# Altium footprint library Cty1.PcbLib: 1378 footprints (part 76 of 87)
Each footprint in its own frame and in the unit in brackets; x right, y up, seen from the top. Pads: shape width x height; smd on the part's side, far side on the other; paste and mask are expansions set on the pad; w line width, h text height; cw(c..) or ccw(c..) is an arc to the next point about the centre after c.
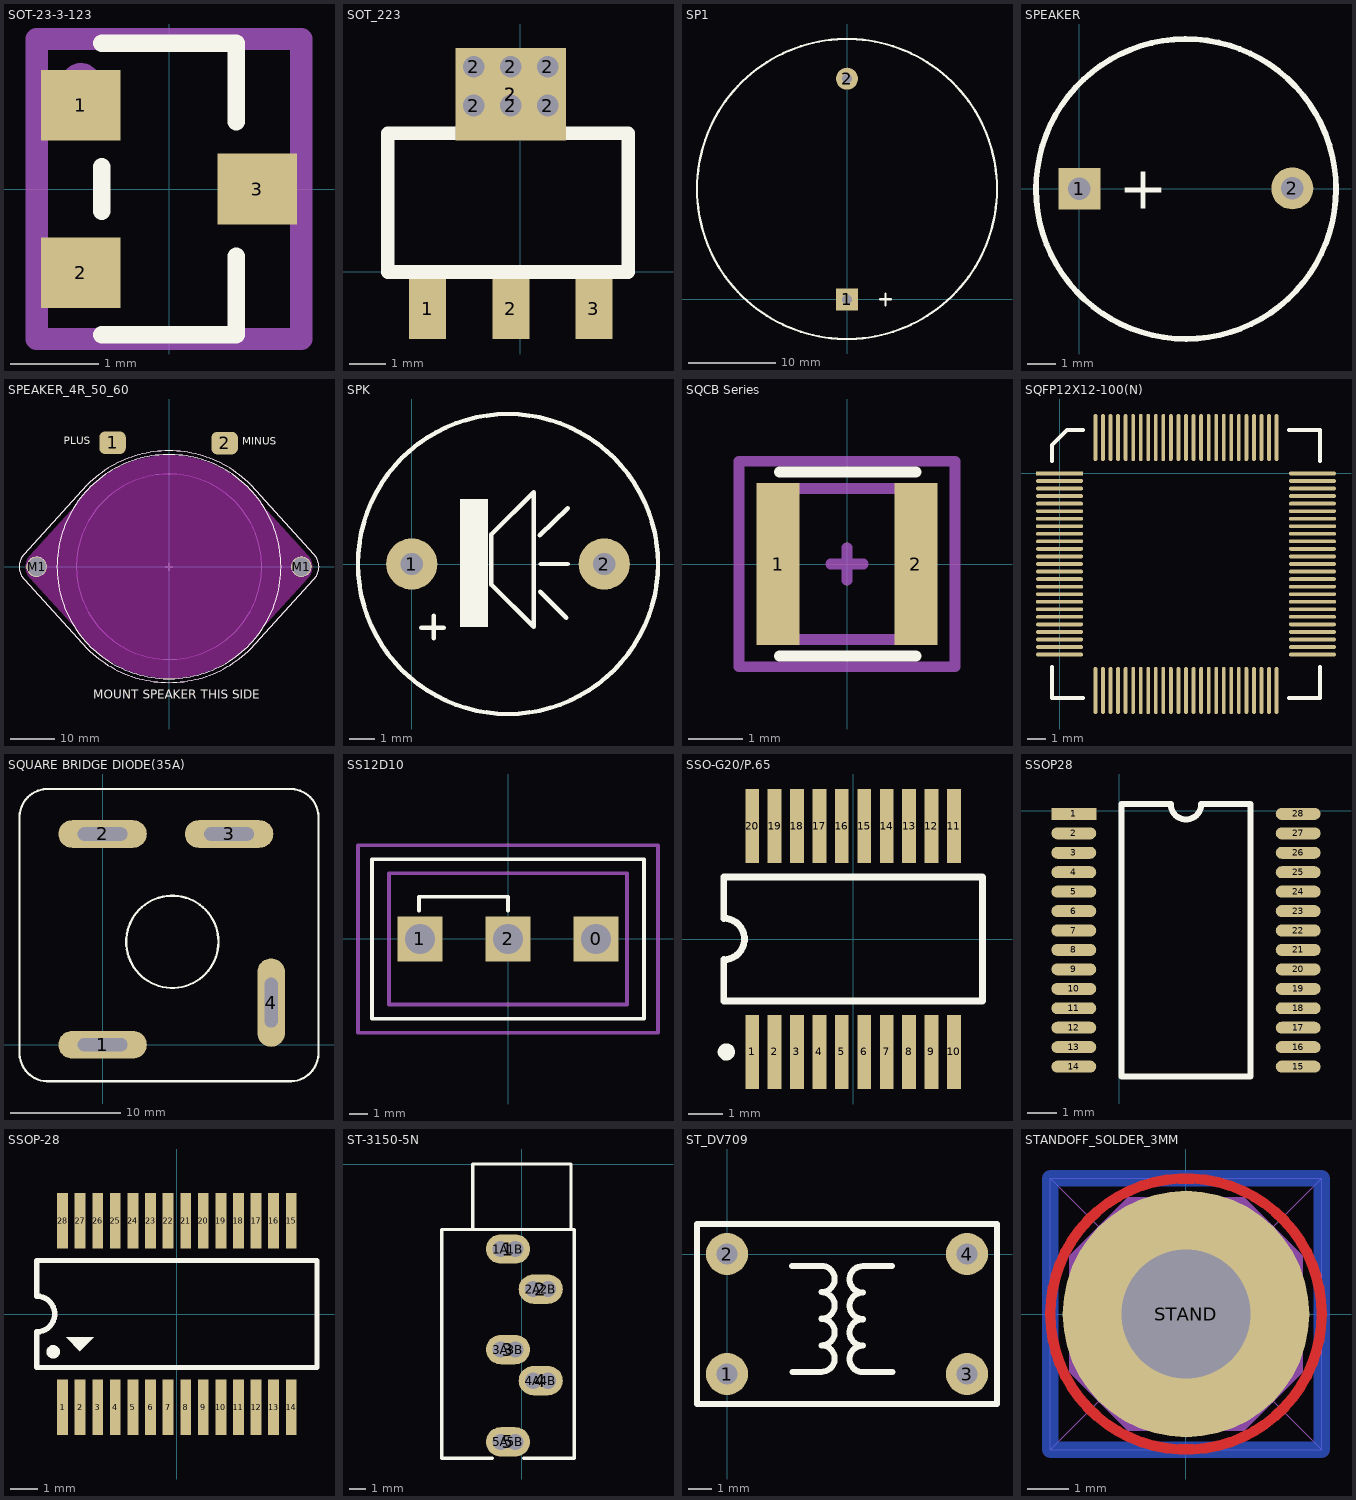
[diagram p75: the footprints below, top view; thin cyan lines are the x and y axes]

## SOT-23-3-123 [mm]
pads (3):
  rect 0.9x0.8 smd: 1(-1,0.95) 2(-1,-0.95) 3(1,0)
Top Overlay:
  lines w0.2: -0.762,-1.651 0.762,-1.651 0.762,-0.762 ; -0.762,-0.254 -0.762,0.254 ; -0.762,1.651 0.762,1.651 0.762,0.762
Mechanical 16:
  circle w0.254: c-1,1.2 r0.1
  lines w0.254: -1.5,-1.7 -1.5,1.7 1.5,1.7 1.5,-1.7 -1.5,-1.7
Mechanical 29:
  text ".Designator" at 0.3,-0.7 h0.6
3D body: height 0.5, standoff 0, extent 0.762,-0.381 1.27,0.381
3D body: height 0.5, standoff 0, extent -1.27,-1.333 -0.762,-0.572
3D body: height 0.5, standoff 0, extent -1.27,0.572 -0.762,1.333
3D body: height 1.1, standoff 0, extent -0.762,-1.651 0.762,1.651

## SOT_223 [mil]
pads (11):
  rect 40x65 smd: 1(-100,-40) 2(-10,-40) 3(80,-40)
  round 39.37 hole 23.62: 2(-50,180) 2(-50,222) 2(-10,180) 2(-10,222) 2(30,180) 2(30,222)
  rect 120x100 smd: 2(-10,192)
  rect 39.37x78.74 smd far side: 2(-10,192)
Top Overlay:
  lines w15: -143,0 117,0 117,150 -143,150 -143,0

## SP1 [mil] "Speaker Telphone on Broad"
height 3
pads (2):
  rect 100x100 hole 45: 1(0,0)
  round 100 hole 45: 2(0,1000)
Top Overlay:
  circle w10: c0,500 r680
  lines w10: 150,0 200,0 ; 174,-28 174,26
3D body "Sonitron-SCS-32 p10-DEFAULT.STEP": height 382.53, standoff -227.75, extent -666.7,-174.54 652.2,1144.36

## SPEAKER [mm]
pads (2):
  rect 1.5x1.5 hole 0.8: 1(0,0)
  round 1.5 hole 0.8: 2(7.62,0.013)
Top Overlay:
  lines w0.203: 7.724,3.67 ccw(c3.816,-0.008) 7.76,3.632
  text "+" at 1.41,-0.711 h1.52
3D body "User Library-Buzzer WST-1203UX.step": height 4.5, standoff -9.65, extent -2.215,-6 13.239,6

## SPEAKER_4R_50_60 [mm] "Header For Connecting Speakers to NB2"
height 6.5
pads (4):
  rrect50% 6x5.08 smd mask+0.038: 1(-12.8,28.1) 2(12.6,28)
  round 4.5 hole 4.2 unplated: M1(-30,0) M1(30,0)
Top Overlay:
  circle w0.4: c30,0 r2.1
  circle w0.4: c-30,0 r2.1
  circle w0.1: c0,0 r25.4
  lines w0.1: -18.562,-18.562 ccw(c0,0) 0,-26.25 ccw(c0,0) 18.562,-18.562 ; -18.562,18.562 cw(c0,0) 0,26.25 cw(c0,0) 18.562,18.562 ; -18.55,-18.55 -32.828,-2.828 cw(c-30,0) -34,0 cw(c-30,0) -32.828,2.828 -18.55,18.55 ; 18.55,-18.55 32.828,-2.828 ccw(c30,0) 34,0 ccw(c30,0) 32.828,2.828 18.55,18.55
  text "PLUS" at -23.833,27.051 h3
  text "MINUS" at 16.604,27 h3
  text "MOUNT SPEAKER THIS SIDE" at -17.225,-29.875 h2
Keep-Out Layer:
  circle w26: c0,0 r12.3
  lines w8: -13.6,-16.4 -28.5,0 -13.6,16.4 ; 13.6,-16.4 28.5,0 13.6,16.4
Mechanical 6:
  circle w0.1: c-30,0 r2.1
  circle w0.1: c30,0 r2.1
  circle w0.1: c0,0 r25.4
  lines w0.1: -30.5,0 -29.5,0 ; -30,-0.5 -30,0.5 ; -0.5,0 0.5,0 ; 0,-0.5 0,0.5 ; 29.5,0 30.5,0 ; 30,-0.5 30,0.5
Mechanical 7:
  circle w0.1: c0,0 r25.4
  circle w0.1: c-30,0 r2.1
  circle w0.1: c30,0 r2.1
  circle w0.1: c0,0 r21
  lines w0.1: -18.562,-18.562 ccw(c0,0) 0,-26.25 ccw(c0,0) 18.562,-18.562 ; -18.562,18.562 cw(c0,0) 0,26.25 cw(c0,0) 18.562,18.562 ; -18.55,-18.55 -32.828,-2.828 cw(c-30,0) -34,0 cw(c-30,0) -32.828,2.828 -18.55,18.55 ; -0.875,0 0,0 ; 0,-0.875 0,0 ; 0,0.875 0,0 ; 0.875,0 0,0 ; 18.55,-18.55 32.828,-2.828 ccw(c30,0) 34,0 ccw(c30,0) 32.828,2.828 18.55,18.55
  text "Mount Speaker This Side" at -14,-29 h3
3D body "Speaker - 50mm - 4 Omh - 3W.stp": height 31.5, standoff -1.5, extent -33.955,-26 33.955,26

## SPK [mil] "Speaker Chip"
height 500
pads (2):
  round 80 hole 35: 1(0,0) 2(300,0)
Top Overlay:
  circle w7: c150,0 r233.73
  rectangle: 75,-98 119,101
  lines w7: 15,-99 50,-99 ; 34,-116 34,-81 ; 199.52,44.52 243,87 ; 200,-43 241,-84 ; 201,0 243,0 ; 124,-32 190,-98 190,112 124,46 124,-32
3D body "Sonitron-SCS-17 P10-DEFAULT.STEP": height 343.51, standoff -267.12, extent -221,-354.14 511.28,378.14

## SQCB Series [mm]
pads (2):
  rect 0.8x3 smd mask+0.01: 1(-1.275,0) 2(1.275,0)
Top Overlay:
  lines w0.2: -1.25,-1.7 1.275,-1.7 ; -1.25,1.7 1.275,1.7
Mechanical 13:
  lines w0.2: -1.395,-1.395 1.395,-1.395 1.395,1.395 -1.395,1.395 -1.395,-1.395
Mechanical 15:
  lines w0.2: -0.3,0 0.3,0 ; 0,-0.3 0,0.3 ; -2,-1.9 2,-1.9 2,1.9 -2,1.9 -2,-1.9
3D body "SQCB7M3R3BAJME.STEP": height 0.76, standoff 0, extent -1.395,-1.395 1.395,1.395

## SQFP12X12-100(N) [mm]
pads (100):
  rect 2.5x0.2 smd: 1(0,0)
  oval 2.5x0.2 smd: 2(0,-0.4) 3(0,-0.8) 4(0,-1.2) 5(0,-1.6) 6(0,-2) 7(0,-2.4) 8(0,-2.8) 9(0,-3.2) 10(0,-3.6) 11(0,-4) 12(0,-4.4) 13(0,-4.8) 14(0,-5.2) 15(0,-5.6) 16(0,-6) 17(0,-6.4) 18(0,-6.8) 19(0,-7.2) 20(0,-7.6) 21(0,-8) 22(0,-8.4) 23(0,-8.8) 24(0,-9.2) 25(0,-9.6) 51(13.4,-9.6) 52(13.4,-9.2) 53(13.4,-8.8) 54(13.4,-8.4) 55(13.4,-8) 56(13.4,-7.6) 57(13.4,-7.2) 58(13.4,-6.8) 59(13.4,-6.4) 60(13.4,-6) 61(13.4,-5.6) 62(13.4,-5.2) 63(13.4,-4.8) 64(13.4,-4.4) 65(13.4,-4) 66(13.4,-3.6) 67(13.4,-3.2) 68(13.4,-2.8) 69(13.4,-2.4) 70(13.4,-2) 71(13.4,-1.6) 72(13.4,-1.2) 73(13.4,-0.8) 74(13.4,-0.4) 75(13.4,0)
  oval 0.2x2.5 smd: 26(1.9,-11.5) 27(2.3,-11.5) 28(2.7,-11.5) 29(3.1,-11.5) 30(3.5,-11.5) 31(3.9,-11.5) 32(4.3,-11.5) 33(4.7,-11.5) 34(5.1,-11.5) 35(5.5,-11.5) 36(5.9,-11.5) 37(6.3,-11.5) 38(6.7,-11.5) 39(7.1,-11.5) 40(7.5,-11.5) 41(7.9,-11.5) 42(8.3,-11.5) 43(8.7,-11.5) 44(9.1,-11.5) 45(9.5,-11.5) 46(9.9,-11.5) 47(10.3,-11.5) 48(10.7,-11.5) 49(11.1,-11.5) 50(11.5,-11.5) 76(11.5,1.9) 77(11.1,1.9) 78(10.7,1.9) 79(10.3,1.9) 80(9.9,1.9) 81(9.5,1.9) 82(9.1,1.9) 83(8.7,1.9) 84(8.3,1.9) 85(7.9,1.9) 86(7.5,1.9) 87(7.1,1.9) 88(6.7,1.9) 89(6.3,1.9) 90(5.9,1.9) 91(5.5,1.9) 92(5.1,1.9) 93(4.7,1.9) 94(4.3,1.9) 95(3.9,1.9) 96(3.5,1.9) 97(3.1,1.9) 98(2.7,1.9) 99(2.3,1.9) 100(1.9,1.9)
Top Overlay:
  lines w0.2: -0.4,-10.25 -0.4,-11.9 1.25,-11.9 ; -0.4,0.65 -0.4,1.5 0.4,2.3 1.25,2.3 ; 12.15,-11.9 13.8,-11.9 13.8,-10.25 ; 12.15,2.3 13.8,2.3 13.8,0.65

## SQUARE BRIDGE DIODE(35A) [mm]
pads (4):
  oval 8x2.5 hole 1.2 slot 4.5 at 0 deg: 1(0,0) 2(0,19.05) 3(11.43,19.05)
  oval 2.5x8 hole 1.2 slot 4.5 at 90 deg: 4(15.24,3.81)
Top Overlay:
  circle w0.2: c6.303,9.304 r4.17
  lines w0.2: -7.504,-0.6 ccw(c-4.952,-0.75) -4.802,-3.302 16.808,-3.302 ccw(c16.958,-0.75) 19.509,-0.6 19.509,20.41 ccw(c16.958,20.56) 16.808,23.111 -4.802,23.111 ccw(c-4.952,20.56) -7.504,20.41 -7.504,-0.6
3D body "User Library-SquareDiodeBridge-L.step": height 8.05, standoff -11, extent -8.281,-4.217 20.219,24.283

## SS12D10 [mm]
pads (3):
  rect 2.4x2.4 hole 1.6 square unplated paste+0 mask+0.01: 0(4.7,0) 1(-4.7,0) 2(0,0)
Top Overlay:
  lines w0.2: -4.75,1.5 -4.75,2.25 0,2.25 0,1.5 ; -7.25,-4.25 7.25,-4.25 7.25,4.25 -7.25,4.25 -7.25,-4.25
Mechanical 13:
  lines w0.2: -6.35,-3.5 6.35,-3.5 6.35,3.5 -6.35,3.5 -6.35,-3.5
Mechanical 15:
  lines w0.2: -1,0 1,0 ; 0,-1 0,1 ; -8,-5 8,-5 8,5 -8,5 -8,-5
3D body "SS12D10.STEP": height 12.66, standoff -5, extent -6.35,-3.5 6.35,3.5

## SSO-G20/P.65 [mm]
height 2
pads (20):
  rect 0.4x2.15 smd: 1(-2.925,-3.275) 2(-2.275,-3.275) 3(-1.625,-3.275) 4(-0.975,-3.275) 5(-0.325,-3.275) 6(0.325,-3.275) 7(0.975,-3.275) 8(1.625,-3.275) 9(2.275,-3.275) 10(2.925,-3.275) 11(2.925,3.275) 12(2.275,3.275) 13(1.625,3.275) 14(0.975,3.275) 15(0.325,3.275) 16(-0.325,3.275) 17(-0.975,3.275) 18(-1.625,3.275) 19(-2.275,3.275) 20(-2.925,3.275)
Top Overlay:
  circle w0.25: c-3.675,-3.275 r0.125
  lines w0.2: -3.75,-1.8 3.75,-1.8 3.75,1.8 -3.75,1.8 -3.75,0.6 cw(c-3.75,0) -3.75,-0.6 -3.75,-1.8

## SSOP28 [mm]
pads (28):
  rect 1.5x0.4 smd: 1(-1.524,-0.098)
  oval 1.5x0.4 smd: 2(-1.524,-0.748) 3(-1.524,-1.398) 4(-1.524,-2.048) 5(-1.524,-2.698) 6(-1.524,-3.348) 7(-1.524,-3.998) 8(-1.524,-4.648) 9(-1.524,-5.298) 10(-1.524,-5.948) 11(-1.524,-6.598) 12(-1.524,-7.248) 13(-1.524,-7.898) 14(-1.524,-8.548) 15(5.976,-8.548) 16(5.976,-7.898) 17(5.976,-7.248) 18(5.976,-6.598) 19(5.976,-5.948) 20(5.976,-5.298) 21(5.976,-4.648) 22(5.976,-3.998) 23(5.976,-3.348) 24(5.976,-2.698) 25(5.976,-2.048) 26(5.976,-1.398) 27(5.976,-0.748) 28(5.976,-0.098)
Top Overlay:
  lines w0.2: 0.061,-8.873 0.061,0.227 1.718,0.227 ccw(c2.226,0.227) 2.734,0.227 4.391,0.227 4.391,-8.873 0.061,-8.873

## SSOP-28 [mm] "SSOP, Plastic; 28 Leads; Body Width 5.3 mm; Pitch 0.65 mm"
height 1.99
pads (28):
  rect 0.4x2.05 smd: 1(-4.225,-3.451) 2(-3.575,-3.451) 3(-2.925,-3.451) 4(-2.275,-3.451) 5(-1.625,-3.451) 6(-0.975,-3.451) 7(-0.325,-3.451) 8(0.325,-3.451) 9(0.975,-3.451) 10(1.625,-3.451) 11(2.275,-3.451) 12(2.925,-3.451) 13(3.575,-3.451) 14(4.225,-3.451) 15(4.225,3.451) 16(3.575,3.451) 17(2.925,3.451) 18(2.275,3.451) 19(1.625,3.451) 20(0.975,3.451) 21(0.325,3.451) 22(-0.325,3.451) 23(-0.975,3.451) 24(-1.625,3.451) 25(-2.275,3.451) 26(-2.925,3.451) 27(-3.575,3.451) 28(-4.225,3.451)
Top Overlay:
  circle w0.25: c-4.57,-1.397 r0.125
  region: -4.089,-0.864 -3.581,-1.372 -3.073,-0.864
  lines w0.2: -5.175,-1.975 -5.175,-0.658 ccw(c-5.175,0) -5.175,0.658 -5.175,1.975 5.175,1.975 5.175,-1.975 -5.175,-1.975
3D body "User Library-SSOP-28-2.step": height 1.98, standoff -0.02, extent -5.1,-3.933 5.1,3.879

## ST-3150-5N [mm] "3.5mm Stereo Jack, 5 pin, 8.1mm wide"
height 12.3
pads (15):
  oval 2.7x1.8 all layers, no hole: 1(-0.85,-5.2) 2(1.15,-7.65) 3(-0.85,-11.35) 4(1.15,-13.25) 5(-0.85,-17)
  round 1.2 hole 1: 1A(-1.3,-5.2) 1B(-0.4,-5.2) 2A(0.7,-7.65) 2B(1.6,-7.65) 3A(-1.3,-11.35) 3B(-0.4,-11.35) 4A(0.7,-13.25) 4B(1.6,-13.25) 5A(-1.3,-17) 5B(-0.4,-17)
Top Overlay:
  lines w0.2: -3,-4 -3,0 3,0 3,-4 ; -1.8,-18 -4.9,-18 -4.9,-4 3.2,-4 3.2,-18 0.1,-18
Mechanical 2:
  lines w1: -1.3,-17 -0.4,-17 ; -1.3,-11.35 -0.4,-11.35 ; -1.3,-5.2 -0.4,-5.2 ; 0.7,-13.25 1.6,-13.25 ; 0.7,-7.65 1.6,-7.65

## ST_DV709 [mil] "Tranformer for Coxial"
pads (4):
  round 70 hole 35: 1(0,-200) 2(0,0) 3(400,-200) 4(400,0)
Top Overlay:
  lines w10: 108.27,-19.69 157.48,-19.69 cw(c157.48,-41.69) 157.48,-63.7 cw(c157.48,-85.71) 157.48,-107.72 ; 108.82,-196.3 157.48,-196.3 ccw(c157.48,-174.29) 157.48,-152.28 ccw(c157.48,-130.28) 157.48,-108.27 ; 226.38,-108.82 ccw(c226.38,-130.82) 226.38,-152.83 ccw(c226.38,-174.84) 226.38,-196.85 275.59,-196.85 ; 226.38,-108.27 cw(c226.38,-86.26) 226.38,-64.25 cw(c226.38,-42.24) 226.38,-20.23 275.04,-20.23 ; -50,-250 450,-250 450,50 -50,50 -50,-250

## STANDOFF_SOLDER_3MM [mm]
pads (1):
  round 6 / inner round 5 / far side round 5 hole 3.15 mask+0.1: STAND(0,0)
Top Layer:
  circle w1: c0,0 r2.2
  circle w0.254: c0,0 r3.3
Bottom Layer:
  lines w0.4: -3.3,-3.3 -3.3,3.3 3.3,3.3 3.3,-3.3 -3.3,-3.3
Mechanical 1:
  circle w0.127: c0,0 r2.2
Mechanical 7:
  circle w0.6: c0,0 r2
  region: -1.7,1.4 -2.8,1.4 -2.8,-1.4 -1.7,-1.4
  region: 0.551,-1.951 1.4,-2.8 2.8,-1.4 1.951,-0.551
  region: 1.951,0.551 2.8,1.4 1.4,2.8 0.551,1.951
  region: -0.551,1.951 -1.4,2.8 -2.8,1.4 -1.951,0.551
  region: -1.951,-0.551 -2.8,-1.4 -1.4,-2.8 -0.551,-1.951
  region: -1.4,-1.7 -1.4,-2.8 1.4,-2.8 1.4,-1.7
  region: 1.4,1.7 1.4,2.8 -1.4,2.8 -1.4,1.7
  region: 2.8,1.4 1.7,1.4 1.7,-1.4 2.8,-1.4
  lines w0.1: -2.8,-1.4 -1.4,-2.8 1.4,-2.8 2.8,-1.4 2.8,1.4 1.4,2.8 -1.4,2.8 -2.8,1.4 -2.8,-1.4
Mechanical 8:
  circle w0.1: c0,0.002 r2.7
  circle w1.2: c0,0 r2.2
  region: -0.5,1.6 -1.6,1.6 -1.6,0.8 -0.5,0.8
  region: -0.8,0.5 -0.8,1.6 -1.6,1.6 -1.6,0.5
  region: -1.066,1.366 -1.366,1.066 -0.8,0.5 -0.5,0.8
  region: 1.6,0.5 1.6,1.6 0.8,1.6 0.8,0.5
  rectangle: 0.5,0.8 1.6,1.6
  region: 1.366,1.066 1.066,1.366 0.5,0.8 0.8,0.5
  rectangle: 0.5,-1.6 1.6,-0.8
  region: 0.8,-0.5 0.8,-1.6 1.6,-1.6 1.6,-0.5
  region: 1.066,-1.366 1.366,-1.066 0.8,-0.5 0.5,-0.8
  region: -1.6,-0.5 -1.6,-1.6 -0.8,-1.6 -0.8,-0.5
  region: -0.5,-0.8 -1.6,-0.8 -1.6,-1.6 -0.5,-1.6
  region: -1.366,-1.066 -1.066,-1.366 -0.5,-0.8 -0.8,-0.5
Mechanical 13:
  lines w0.025: -0.25,-0.25 -3.3,-3.3 ; -0.25,0.25 -3.3,3.3 ; -0.2,0 0,0 ; 0,-0.2 0,0 ; 0,0.2 0,0 ; 0.2,0 0,0 ; 0.25,-0.25 3.3,-3.3 ; 0.25,0.25 3.3,3.3 ; -3.3,-3.3 3.3,-3.3 ; -3.3,-3.3 -3.3,3.3 ; -3.3,3.3 3.3,3.3 ; 3.3,-3.3 3.3,3.3
3D body "spacer gold2.STEP": height 8.5, standoff -3.5, extent -2.76,-2.764 2.74,2.736